# Altium footprint library Semi-ATE.PcbLib: 155 footprints (part 9 of 10)
Each footprint in its own frame and in the unit in brackets; x right, y up, seen from the top. Pads: shape width x height; smd on the part's side, far side on the other; paste and mask are expansions set on the pad; w line width, h text height; cw(c..) or ccw(c..) is an arc to the next point about the centre after c.
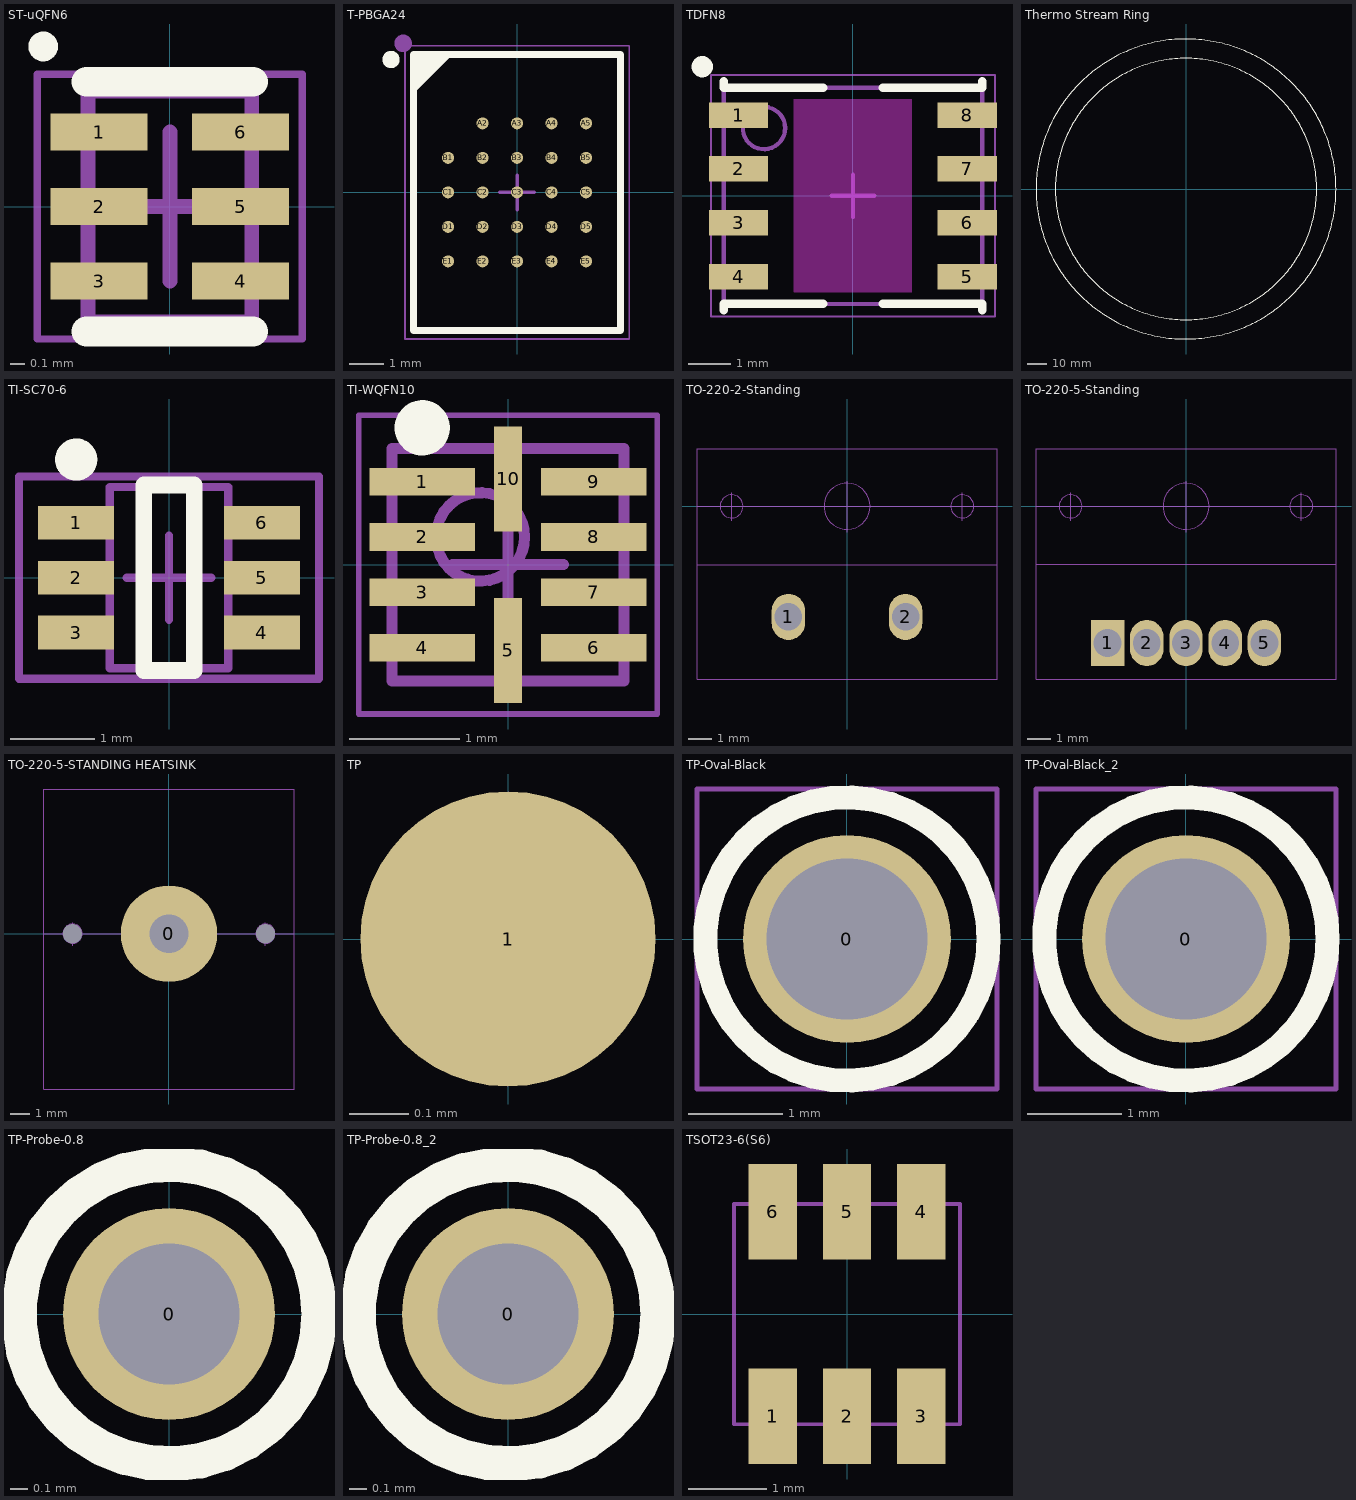
[diagram p8: the footprints below, top view; thin cyan lines are the x and y axes]

## ST-uQFN6 [mm]
height 0.6
pads (6):
  rect 0.65x0.25 smd: 1(-0.475,0.5) 2(-0.475,0) 3(-0.475,-0.5) 4(0.475,-0.5) 5(0.475,0) 6(0.475,0.5)
Top Overlay:
  circle w0.1: c-0.85,1.075 r0.05
  lines w0.2: -0.559,-0.838 0.559,-0.838 ; -0.559,0.838 0.559,0.838
Top Designator:
  text ".Designator" at -7.636,-0.389 h1.52
Top 3D Body:
  lines w0.05: -0.889,-0.889 -0.889,0.889 0.889,0.889 0.889,-0.889 -0.889,-0.889
Bottom 3D Body:
  lines w0.1: -0.55,-0.775 0.55,-0.775 0.55,0.775 -0.55,0.775 -0.55,-0.775
Bottom Gold Plating:
  lines w0.1: -0.5,0 0.5,0 ; 0,-0.5 0,0.5
3D body: height 0.6, standoff 0, extent -0.55,-0.775 0.55,0.775

## T-PBGA24 [mm] "BGA100P9X9-81A"
height 1.2
pads (24):
  round 0.35 smd: A2(-1,2) A3(0,2) A4(1,2) A5(2,2) B1(-2,1) B2(-1,1) B3(0,1) B4(1,1) B5(2,1) C1(-2,0) C2(-1,0) C3(0,0) C4(1,0) C5(2,0) D1(-2,-1) D2(-1,-1) D3(0,-1) D4(1,-1) D5(2,-1) E1(-2,-2) E2(-1,-2) E3(0,-2) E4(1,-2) E5(2,-2)
Top Overlay:
  circle w0.25: c-3.65,3.85 r0.125
  region: -2,4 -3,3 -3,4
  lines w0.2: -3,3 -2,4 ; -3,-4 -3,4 3,4 3,-4 -3,-4
Top Designator:
  text ".Designator" at -7.93,-0.359 h1.52
Top 3D Body:
  lines w0.05: -3.25,-4.25 -3.25,4.25 3.25,4.25 3.25,-4.25 -3.25,-4.25
Bottom 3D Body:
  circle w0.254: c-3.302,4.318 r0.127
  lines w0.1: -3,-4 3,-4 3,4 -3,4 -3,-4
Bottom Gold Plating:
  lines w0.1: -0.5,0 0.5,0 ; 0,-0.5 0,0.5
3D body: height 1.2, standoff 0.2, extent -3,-4 3,4

## TDFN8 [mm]
height 0.8
pads (8):
  rect 1.4x0.6 smd: 1(-2.7,1.905) 2(-2.7,0.635) 3(-2.7,-0.635) 4(-2.7,-1.905) 5(2.7,-1.905) 6(2.7,-0.635) 7(2.7,0.635) 8(2.7,1.905)
Top Layer keep-out:
  rectangle: -1.4,-2.286 1.394,2.286
Top Overlay:
  circle w0.25: c-3.556,3.048 r0.125
  lines w0.2: -3.05,-2.7 -3.05,-2.55 -0.7,-2.55 ; -3.05,2.7 -3.05,2.55 -0.7,2.55 ; 0.7,-2.55 3.05,-2.55 3.05,-2.7 ; 0.7,2.55 3.05,2.55 3.05,2.7
Top Designator:
  text ".Designator" at -7.77,-0.296 h1.52
Top 3D Body:
  lines w0.05: -3.35,-2.85 3.35,-2.85 3.35,2.85 -3.35,2.85 -3.35,-2.85
Bottom 3D Body:
  circle w0.1: c-2.1,1.6 r0.5
  lines w0.1: -3.05,-2.55 -3.05,2.55 3.05,2.55 3.05,-2.55 -3.05,-2.55
Bottom Gold Plating:
  lines w0.1: -0.5,0 0.5,0 ; 0,-0.5 0,0.5
3D body: height 0.8, standoff 0, extent -3.05,-2.55 3.05,2.55

## Thermo Dowel [mm]
Top Designator:
  text ".Designator" at -7.617,-0.508 h1.52
3D body "ThermoDowel.STEP": height 11.5, standoff 0, extent -3,-3 3,3

## Thermo Stream Ring [mm]
Top Overlay:
  circle w0.127: c0,0 r67.5
  circle w0.127: c0,0 r77.5
Top Designator:
  text ".Designator" at -7.617,-0.508 h1.52
3D body "ThermoStreamRing.STEP": height 15, standoff 0, extent -77.5,-77.5 77.5,77.5

## TI-SC70-6 [mm] "SC70, 6-Leads, Body 2.00x2.10mm, Pitch 0.65mm, IPC High Density"
height 1.1
pads (6):
  rect 0.9x0.4 smd: 1(-1.1,0.65) 2(-1.1,0) 3(-1.1,-0.65) 4(1.1,-0.65) 5(1.1,0) 6(1.1,0.65)
Top Overlay:
  circle w0.25: c-1.1,1.4 r0.125
  lines w0.2: -0.3,-1.1 0.3,-1.1 0.3,1.1 -0.3,1.1 -0.3,-1.1
Top Designator:
  text ".Designator" at -7.618,-0.308 h1.52
Top 3D Body:
  lines w0.1: -1.778,-1.2 1.778,-1.2 1.778,1.2 -1.778,1.2 -1.778,-1.2
Bottom 3D Body:
  lines w0.1: -0.7,-1.075 -0.7,1.075 0.7,1.075 0.7,-1.075 -0.7,-1.075
Bottom Gold Plating:
  lines w0.1: -0.5,0 0.5,0 ; 0,-0.5 0,0.5
3D body: height 1.1, standoff 0, extent -0.7,-1.075 0.7,1.075

## TI-WQFN10 [mm] "QFN, 10-Leads, Body 2.00x2.00mm, Pitch 0.50mm, IPC High Density"
height 0.8
pads (10):
  rect 0.95x0.25 smd: 1(-0.775,0.75) 2(-0.775,0.25) 3(-0.775,-0.25) 4(-0.775,-0.75) 6(0.775,-0.75) 7(0.775,-0.25) 8(0.775,0.25) 9(0.775,0.75)
  rect 0.25x0.95 smd: 5(0,-0.775) 10(0,0.775)
Top Overlay:
  circle w0.25: c-0.775,1.236 r0.125
Top Designator:
  text ".Designator" at -7.618,-0.452 h1.52
Top 3D Body:
  lines w0.05: -1.35,-1.35 1.35,-1.35 1.35,1.35 -1.35,1.35 -1.35,-1.35
Bottom 3D Body:
  circle w0.1: c-0.25,0.25 r0.4
  lines w0.1: -1.05,-1.05 1.05,-1.05 1.05,1.05 -1.05,1.05 -1.05,-1.05
Bottom Gold Plating:
  lines w0.1: -0.5,0 0.5,0 ; 0,-0.5 0,0.5
3D body: height 0.8, standoff 0, extent -1.05,-1.05 1.05,1.05

## TO-220-2-Standing [mm]
pads (2):
  oval 1.45x2 hole 1.2: 1(-2.54,-4.792) 2(2.54,-4.792)
Top Designator:
  text ".Designator" at -7.618,-3.008 h1.52
Top 3D Body:
  lines w0.05: -6.5,-2.542 6.5,-2.542 ; -6.5,-7.5 6.5,-7.5 6.5,2.5 -6.5,2.5 -6.5,-7.5
Bottom Gold Plating:
  circle w0.013: c5,0 r0.5
  circle w0.013: c-5,0 r0.5
  circle w0.013: c0,0 r1
  lines w0.013: -6.5,0 6.5,0 ; -5,-0.621 -5,0.579 ; 0,-1.121 0,1.079 ; 5,-0.621 5,0.579
3D body "TO220-2-Standing.STEP": height 17.95, standoff -2.47, extent -4.826,-7.042 4.826,-2.542

## TO-220-5-Standing [mm]
pads (5):
  rect 1.45x2 hole 1.2: 1(-3.4,-5.921)
  oval 1.45x2 hole 1.2: 2(-1.7,-5.921) 3(0,-5.921) 4(1.7,-5.921) 5(3.4,-5.921)
Top Designator:
  text ".Designator" at -7.618,-3.008 h1.52
Top 3D Body:
  lines w0.05: -6.5,-2.5 6.5,-2.5 ; -6.5,-7.5 -6.5,2.5 6.5,2.5 6.5,-7.5 -6.5,-7.5
Bottom Gold Plating:
  circle w0.013: c0,0 r1
  circle w0.013: c-5,0 r0.5
  circle w0.013: c5,0 r0.5
  lines w0.013: -6.5,0 6.5,0 ; -5,-0.621 -5,0.579 ; 0,-1.121 0,1.079 ; 5,-0.621 5,0.579
3D body "TO220-5-Standing.STEP": height 18.05, standoff -2.47, extent -5.335,-7.391 5.335,-2.551

## TO-220-5-STANDING HEATSINK [mm]
pads (3):
  round 0 hole 1 unplated paste+0: 0(-5,0) 0(5,0)
  round 5 / inner round 2.5 / far side round 6 hole 2 paste+0: 0(0,0)
Top Designator:
  text ".Designator" at -7.617,-0.782 h1.52
Top 3D Body:
  lines w0.05: -6.5,-8.049 6.5,-8.049 6.5,7.5 -6.5,7.5 -6.5,-8.049
Bottom Gold Plating:
  circle w0.013: c5,0 r0.5
  circle w0.013: c-5,0 r0.5
  circle w0.013: c0,0 r1
  lines w0.013: -6.5,0 6.5,0 ; -5,-0.621 -5,0.579 ; 0,-1.121 0,1.079 ; 5,-0.621 5,0.579
3D body "TO220-5-HeatSinkAssembly.STEP": height 22, standoff -3.4, extent -6.5,-8.049 6.5,7.5

## TP [mm]
height 2.65
pads (1):
  round 0.5 smd: 1(0,0)
Top Designator:
  text ".Designator" at -7.618,-0.508 h1.52

## TP-Oval-Black [mm]
pads (1):
  round 2.2 hole 1.7 paste+0 mask+0: 0(0,0)
Top Overlay:
  circle w0.254: c0,0 r1.5
Top Designator:
  text ".Designator" at -7.618,-0.508 h1.52
Top 3D Body:
  lines w0.05: -1.587,-1.587 1.588,-1.587 1.588,1.588 -1.587,1.588 -1.587,-1.587
3D body "TP-Oval-Black.step": height 8.13, standoff -3.1, extent -1.587,-1.587 1.588,1.588

## TP-Oval-Black_2 [mm]
pads (1):
  round 2.2 hole 1.7 paste+0 mask+0: 0(0,0)
Top Overlay:
  circle w0.254: c0,0 r1.5
Top Designator:
  text ".Designator" at -7.618,-0.508 h1.52
Top 3D Body:
  lines w0.05: -1.587,-1.587 -1.587,1.588 1.588,1.588 1.588,-1.587 -1.587,-1.587
3D body "TP-Oval-Black.step": height 8.13, standoff -3.1, extent -1.587,-1.587 1.588,1.588

## TP-Probe-0.8 [mm] "Test Point 0.8 mm hole for Probe"
pads (1):
  round 1.2 hole 0.8 paste+0 mask+0: 0(0,0)
Top Overlay:
  circle w0.2: c0,0 r0.85
Top Designator:
  text ".Designator" at -7.618,-0.508 h1.52

## TP-Probe-0.8_2 [mm]
pads (1):
  round 1.2 hole 0.8 paste+0 mask+0: 0(0,0)
Top Overlay:
  circle w0.2: c0,0 r0.85
Top Designator:
  text ".Designator" at -7.618,-0.508 h1.52

## TSOT23-6(S6) [mm] "6-Lead Plastic TSOT-23"
pads (6):
  rect 0.62x1.225 smd: 1(-0.95,-1.31) 2(0,-1.31) 3(0.95,-1.31) 4(0.95,1.31) 5(0,1.31) 6(-0.95,1.31)
Top Overlay:
  text "." at -1.016,-2.413 h1
Top Designator:
  text ".Designator" at -7.618,-0.829 h1.52
Top 3D Body:
  lines w0.05: -1.45,-1.412 1.45,-1.412 1.45,1.412 -1.45,1.412 -1.45,-1.412
3D body "TSOT-23-6(S6).STEP": height 1, standoff 0, extent -1.45,-1.412 1.45,1.412